# Altium schematic symbol library 6-Connectors 连接器.端子.SchLib: 402 symbols (part 4 of 5)
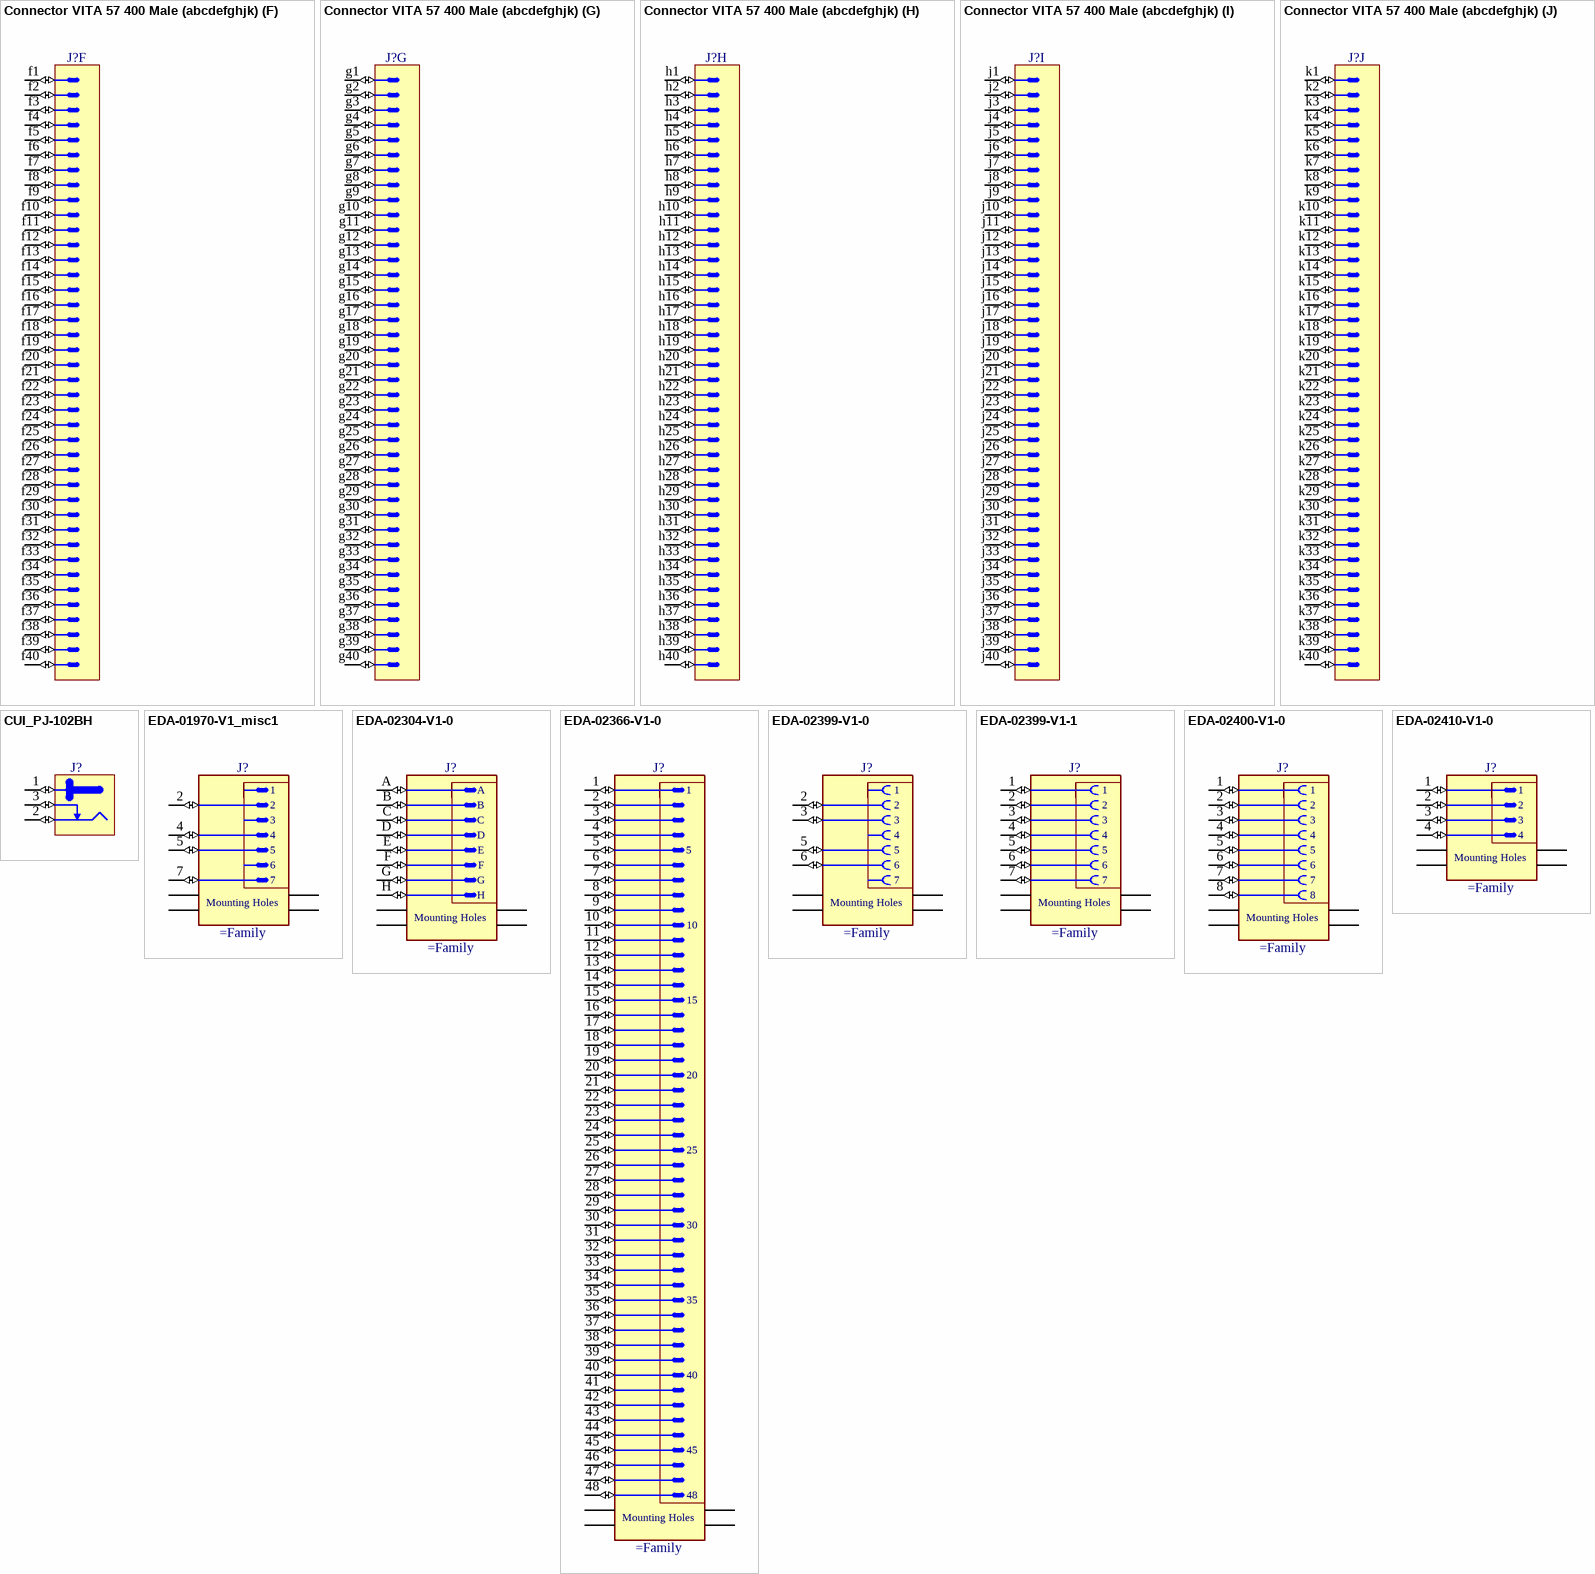
[diagram p52: symbols Connector VITA 57 400 Male (abcdefghjk) to EDA-02410-V1-0]

## EDA-02410-V1-0
designator J?
SOURIAU UTO0104P21T Adapter Kit For PCB Mount, 4 Poles, Shell Size 10, UT Bantam Circular Male Connector
pins: 1 (io), 2 (io), 3 (io), 4 (io), MECH1 (power), MECH2 (power), MECH3 (power), MECH4 (power)
text: Mounting; Holes

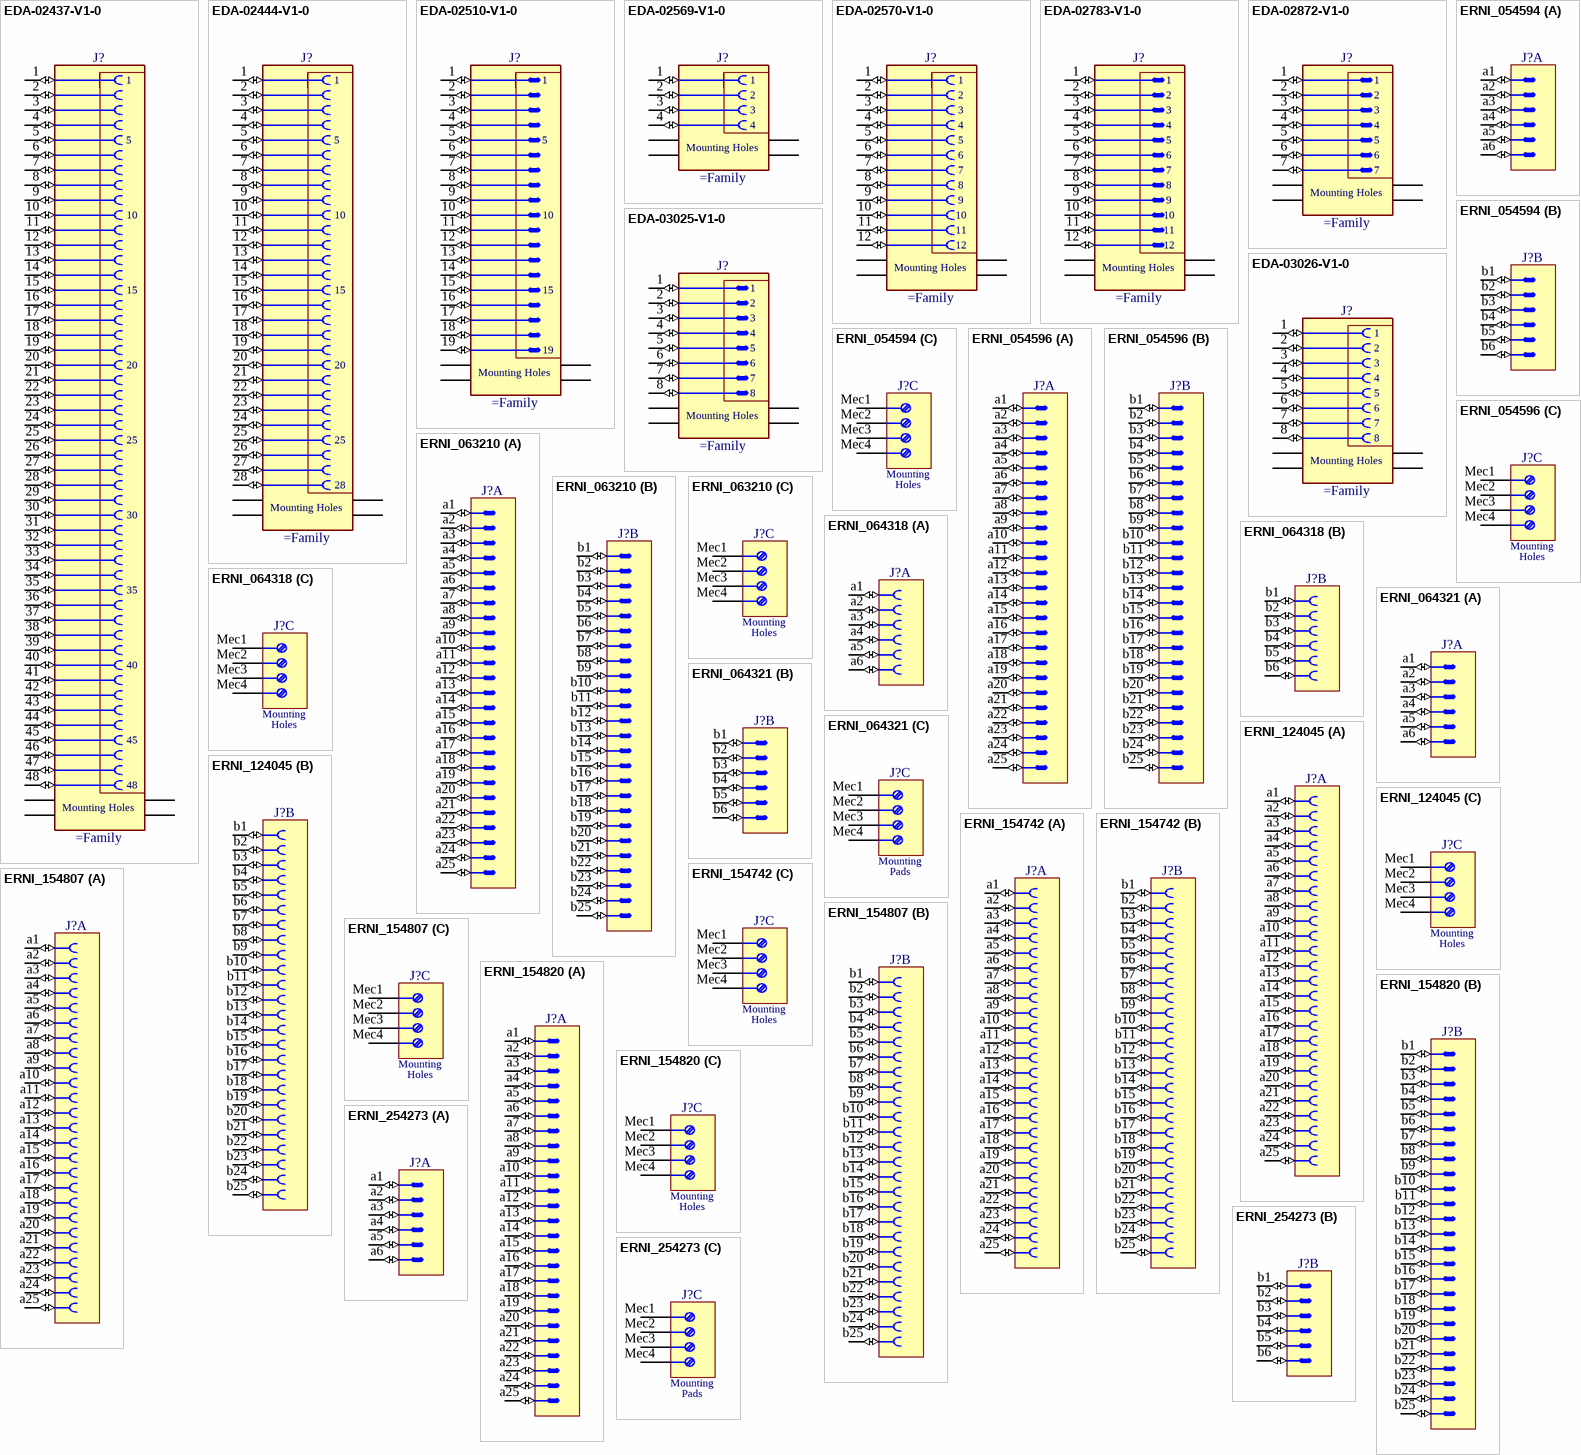
[diagram p35: symbols EDA-02437-V1-0 to ERNI_254273]

## EDA-02437-V1-0
designator J?
Adapter Kit For PCB Mount For SOURIAU UTO02448S21T, 48 Poles, Shell Size 24, UT Bantam Circular Female Connector. UTO Series
pins: 1 (io), 2 (io), 3 (io), 4 (io), 5 (io), 6 (io), 7 (io), 8 (io), 9 (io), 10 (io), 11 (io), 12 (io), 13 (io), 14 (io), 15 (io), 16 (io), 17 (io), 18 (io), 19 (io), 20 (io), 21 (io), 22 (io), 23 (io), 24 (io), 25 (io), 26 (io), 27 (io), 28 (io), 29 (io), 30 (io), 31 (io), 32 (io), 33 (io), 34 (io), 35 (io), 36 (io), 37 (io), 38 (io), 39 (io), 40 (io), 41 (io), 42 (io), 43 (io), 44 (io), 45 (io), 46 (io), 47 (io), 48 (io), MECH1 (power), MECH2 (power), MECH3 (power), MECH4 (power)
text: Mounting; Holes

## EDA-02444-V1-0
designator J?
Adapter Kit For PCB Mount For SOURIAU UTG02028S03, 28 Poles, Shell Size 20, Metalok Bantam Circular Female Connector. UTG Series
pins: 1 (io), 2 (io), 3 (io), 4 (io), 5 (io), 6 (io), 7 (io), 8 (io), 9 (io), 10 (io), 11 (io), 12 (io), 13 (io), 14 (io), 15 (io), 16 (io), 17 (io), 18 (io), 19 (io), 20 (io), 21 (io), 22 (io), 23 (io), 24 (io), 25 (io), 26 (io), 27 (io), 28 (io), MECH1 (power), MECH2 (power), MECH3 (power), MECH4 (power)
text: Mounting; Holes

## EDA-02510-V1-0
designator J?
SOURIAU UTO02448P21T Adapter Kit For PCB Mount, 19 Poles, Shell Size 16, UT Bantam Circular Male Connector
pins: 1 (io), 2 (io), 3 (io), 4 (io), 5 (io), 6 (io), 7 (io), 8 (io), 9 (io), 10 (io), 11 (io), 12 (io), 13 (io), 14 (io), 15 (io), 16 (io), 17 (io), 18 (io), 19 (io), MECH1 (power), MECH2 (power), MECH3 (power), MECH4 (power)
text: Mounting; Holes

## EDA-02569-V1-0
designator J?
SOURIAU UTO0104S21T Adapter Kit For PCB Mount, 4 Poles, Shell Size 10, UT Bantam Circular Female Connector
pins: 1 (io), 2 (io), 3 (io), 4 (io), MECH1 (power), MECH2 (power), MECH3 (power), MECH4 (power)
text: Mounting; Holes

## EDA-02570-V1-0
designator J?
SOURIAU UTO01412S21T Adapter Kit For PCB Mount, 12 Poles, Shell Size 14, UT Bantam Circular Female Connector
pins: 1 (io), 2 (io), 3 (io), 4 (io), 5 (io), 6 (io), 7 (io), 8 (io), 9 (io), 10 (io), 11 (io), 12 (io), MECH1 (power), MECH2 (power), MECH3 (power), MECH4 (power)
text: Mounting; Holes

## EDA-02783-V1-0
designator J?
SOURIAU UTO01412P21T Adapter Kit For PCB Mount, 12 Poles, Shell Size 14, UT Bantam Circular Male Connector
pins: 1 (io), 2 (io), 3 (io), 4 (io), 5 (io), 6 (io), 7 (io), 8 (io), 9 (io), 10 (io), 11 (io), 12 (io), MECH1 (power), MECH2 (power), MECH3 (power), MECH4 (power)
text: Mounting; Holes

## EDA-02872-V1-0
designator J?
SOURIAU UTG0187PVDEX Adapter Kit For PCB Mount, 7 Poles, VDE  Metalok Bantam Circular Male Connector
pins: 1 (io), 2 (io), 3 (io), 4 (io), 5 (io), 6 (io), 7 (io), MECH1 (power), MECH2 (power), MECH3 (power), MECH4 (power)
text: Mounting; Holes

## EDA-03025-V1-0
designator J?
SOURIAU UTO0128P21T Adapter Kit For PCB Mount, 8 Poles, Shell Size 12, UT Bantam Circular Male Connector
pins: 1 (io), 2 (io), 3 (io), 4 (io), 5 (io), 6 (io), 7 (io), 8 (io), MECH1 (power), MECH2 (power), MECH3 (power), MECH4 (power)
text: Mounting; Holes

## EDA-03026-V1-0
designator J?
SOURIAU UTO0128S21T Adapter Kit For PCB Mount, 8 Poles, Shell Size 12, UT Bantam Circular Female Connector
pins: 1 (io), 2 (io), 3 (io), 4 (io), 5 (io), 6 (io), 7 (io), 8 (io), MECH1 (power), MECH2 (power), MECH3 (power), MECH4 (power)
text: Mounting; Holes

## ERNI_054594
designator J?
12 Contacts Pitch 1.27 SMC Right Angle Male Connector Type B
part A pins: a1 1 (io), a2 2 (io), a3 3 (io), a4 4 (io), a5 5 (io), a6 6 (io)
part B pins: b1 1 (io), b2 2 (io), b3 3 (io), b4 4 (io), b5 5 (io), b6 6 (io)
part C pins: Mec1 "Mounting Fixture", Mec2 "Mounting Fixture", Mec3 "Mounting Fixture", Mec4 "Mounting Fixture"
part C text: Mounting; Holes

## ERNI_054596
designator J?
50 Contacts Pitch 1.27 SMC Right Angle Male Connector Type B
part A pins: a1 1 (io), a2 2 (io), a3 3 (io), a4 4 (io), a5 5 (io), a6 6 (io), a7 7 (io), a8 8 (io), a9 9 (io), a10 10 (io), a11 11 (io), a12 12 (io), a13 13 (io), a14 14 (io), a15 15 (io), a16 16 (io), a17 17 (io), a18 18 (io), a19 19 (io), a20 20 (io), a21 21 (io), a22 22 (io), a23 23 (io), a24 24 (io), a25 25 (io)
part B pins: b1 1 (io), b2 2 (io), b3 3 (io), b4 4 (io), b5 5 (io), b6 6 (io), b7 7 (io), b8 8 (io), b9 9 (io), b10 10 (io), b11 11 (io), b12 12 (io), b13 13 (io), b14 14 (io), b15 15 (io), b16 16 (io), b17 17 (io), b18 18 (io), b19 19 (io), b20 20 (io), b21 21 (io), b22 22 (io), b23 23 (io), b24 24 (io), b25 25 (io)
part C pins: Mec1 "Mounting Fixture", Mec2 "Mounting Fixture", Mec3 "Mounting Fixture", Mec4 "Mounting Fixture"
part C text: Mounting; Holes

## ERNI_063210
designator J?
50 Contacts Pitch 1.27 SMC Straight Male Connector Type Q
part A pins: a1 1 (io), a2 2 (io), a3 3 (io), a4 4 (io), a5 5 (io), a6 6 (io), a7 7 (io), a8 8 (io), a9 9 (io), a10 10 (io), a11 11 (io), a12 12 (io), a13 13 (io), a14 14 (io), a15 15 (io), a16 16 (io), a17 17 (io), a18 18 (io), a19 19 (io), a20 20 (io), a21 21 (io), a22 22 (io), a23 23 (io), a24 24 (io), a25 25 (io)
part B pins: b1 1 (io), b2 2 (io), b3 3 (io), b4 4 (io), b5 5 (io), b6 6 (io), b7 7 (io), b8 8 (io), b9 9 (io), b10 10 (io), b11 11 (io), b12 12 (io), b13 13 (io), b14 14 (io), b15 15 (io), b16 16 (io), b17 17 (io), b18 18 (io), b19 19 (io), b20 20 (io), b21 21 (io), b22 22 (io), b23 23 (io), b24 24 (io), b25 25 (io)
part C pins: Mec1 "Mounting Fixture", Mec2 "Mounting Fixture", Mec3 "Mounting Fixture", Mec4 "Mounting Fixture"
part C text: Mounting; Holes

## ERNI_064318
designator J?
12 Contacts Pitch 1.27 SMC Vertical Female Connector Type B
part A pins: a1 1 (io), a2 2 (io), a3 3 (io), a4 4 (io), a5 5 (io), a6 6 (io)
part B pins: b1 1 (io), b2 2 (io), b3 3 (io), b4 4 (io), b5 5 (io), b6 6 (io)
part C pins: Mec1 "Mounting Fixture", Mec2 "Mounting Fixture", Mec3 "Mounting Fixture", Mec4 "Mounting Fixture"
part C text: Mounting; Holes

## ERNI_064321
designator J?
12 Contacts Pitch 1.27 SMC Vertical Male Connector Type Q
part A pins: a1 1 (io), a2 2 (io), a3 3 (io), a4 4 (io), a5 5 (io), a6 6 (io)
part B pins: b1 1 (io), b2 2 (io), b3 3 (io), b4 4 (io), b5 5 (io), b6 6 (io)
part C pins: Mec1 "Mounting Fixture", Mec2 "Mounting Fixture", Mec3 "Mounting Fixture", Mec4 "Mounting Fixture"
part C text: Mounting; Pads

## ERNI_124045
designator J?
50 Contacts Pitch 1.27  SMC Straight  Female Connector Type B
part A pins: a1 1 (io), a2 2 (io), a3 3 (io), a4 4 (io), a5 5 (io), a6 6 (io), a7 7 (io), a8 8 (io), a9 9 (io), a10 10 (io), a11 11 (io), a12 12 (io), a13 13 (io), a14 14 (io), a15 15 (io), a16 16 (io), a17 17 (io), a18 18 (io), a19 19 (io), a20 20 (io), a21 21 (io), a22 22 (io), a23 23 (io), a24 24 (io), a25 25 (io)
part B pins: b1 1 (io), b2 2 (io), b3 3 (io), b4 4 (io), b5 5 (io), b6 6 (io), b7 7 (io), b8 8 (io), b9 9 (io), b10 10 (io), b11 11 (io), b12 12 (io), b13 13 (io), b14 14 (io), b15 15 (io), b16 16 (io), b17 17 (io), b18 18 (io), b19 19 (io), b20 20 (io), b21 21 (io), b22 22 (io), b23 23 (io), b24 24 (io), b25 25 (io)
part C pins: Mec1 "Mounting Fixture", Mec2 "Mounting Fixture", Mec3 "Mounting Fixture", Mec4 "Mounting Fixture"
part C text: Mounting; Holes

## ERNI_154742
designator J?
50 Contacts Pitch 1.27  SMC Right Angle Female Connector Type Q
part A pins: a1 1 (io), a2 2 (io), a3 3 (io), a4 4 (io), a5 5 (io), a6 6 (io), a7 7 (io), a8 8 (io), a9 9 (io), a10 10 (io), a11 11 (io), a12 12 (io), a13 13 (io), a14 14 (io), a15 15 (io), a16 16 (io), a17 17 (io), a18 18 (io), a19 19 (io), a20 20 (io), a21 21 (io), a22 22 (io), a23 23 (io), a24 24 (io), a25 25 (io)
part B pins: b1 1 (io), b2 2 (io), b3 3 (io), b4 4 (io), b5 5 (io), b6 6 (io), b7 7 (io), b8 8 (io), b9 9 (io), b10 10 (io), b11 11 (io), b12 12 (io), b13 13 (io), b14 14 (io), b15 15 (io), b16 16 (io), b17 17 (io), b18 18 (io), b19 19 (io), b20 20 (io), b21 21 (io), b22 22 (io), b23 23 (io), b24 24 (io), b25 25 (io)
part C pins: Mec1 "Mounting Fixture", Mec2 "Mounting Fixture", Mec3 "Mounting Fixture", Mec4 "Mounting Fixture"
part C text: Mounting; Holes

## ERNI_154807
designator J?
50 Contacts Pitch 1.27  SMC Straight  Female Connector Type B
part A pins: a1 1 (io), a2 2 (io), a3 3 (io), a4 4 (io), a5 5 (io), a6 6 (io), a7 7 (io), a8 8 (io), a9 9 (io), a10 10 (io), a11 11 (io), a12 12 (io), a13 13 (io), a14 14 (io), a15 15 (io), a16 16 (io), a17 17 (io), a18 18 (io), a19 19 (io), a20 20 (io), a21 21 (io), a22 22 (io), a23 23 (io), a24 24 (io), a25 25 (io)
part B pins: b1 1 (io), b2 2 (io), b3 3 (io), b4 4 (io), b5 5 (io), b6 6 (io), b7 7 (io), b8 8 (io), b9 9 (io), b10 10 (io), b11 11 (io), b12 12 (io), b13 13 (io), b14 14 (io), b15 15 (io), b16 16 (io), b17 17 (io), b18 18 (io), b19 19 (io), b20 20 (io), b21 21 (io), b22 22 (io), b23 23 (io), b24 24 (io), b25 25 (io)
part C pins: Mec1 "Mounting Fixture", Mec2 "Mounting Fixture", Mec3 "Mounting Fixture", Mec4 "Mounting Fixture"
part C text: Mounting; Holes

## ERNI_154820
designator J?
50 Contacts Pitch 1.27 SMC Straight Male Connector Type Q
part A pins: a1 1 (io), a2 2 (io), a3 3 (io), a4 4 (io), a5 5 (io), a6 6 (io), a7 7 (io), a8 8 (io), a9 9 (io), a10 10 (io), a11 11 (io), a12 12 (io), a13 13 (io), a14 14 (io), a15 15 (io), a16 16 (io), a17 17 (io), a18 18 (io), a19 19 (io), a20 20 (io), a21 21 (io), a22 22 (io), a23 23 (io), a24 24 (io), a25 25 (io)
part B pins: b1 1 (io), b2 2 (io), b3 3 (io), b4 4 (io), b5 5 (io), b6 6 (io), b7 7 (io), b8 8 (io), b9 9 (io), b10 10 (io), b11 11 (io), b12 12 (io), b13 13 (io), b14 14 (io), b15 15 (io), b16 16 (io), b17 17 (io), b18 18 (io), b19 19 (io), b20 20 (io), b21 21 (io), b22 22 (io), b23 23 (io), b24 24 (io), b25 25 (io)
part C pins: Mec1 "Mounting Fixture", Mec2 "Mounting Fixture", Mec3 "Mounting Fixture", Mec4 "Mounting Fixture"
part C text: Mounting; Holes

## ERNI_254273
designator J?
12 Contacts Pitch 1.27 SMC Right Angle Male Connector Type B
part A pins: a1 1 (io), a2 2 (io), a3 3 (io), a4 4 (io), a5 5 (io), a6 6 (io)
part B pins: b1 1 (io), b2 2 (io), b3 3 (io), b4 4 (io), b5 5 (io), b6 6 (io)
part C pins: Mec1 "Mounting Fixture", Mec2 "Mounting Fixture", Mec3 "Mounting Fixture", Mec4 "Mounting Fixture"
part C text: Mounting; Pads

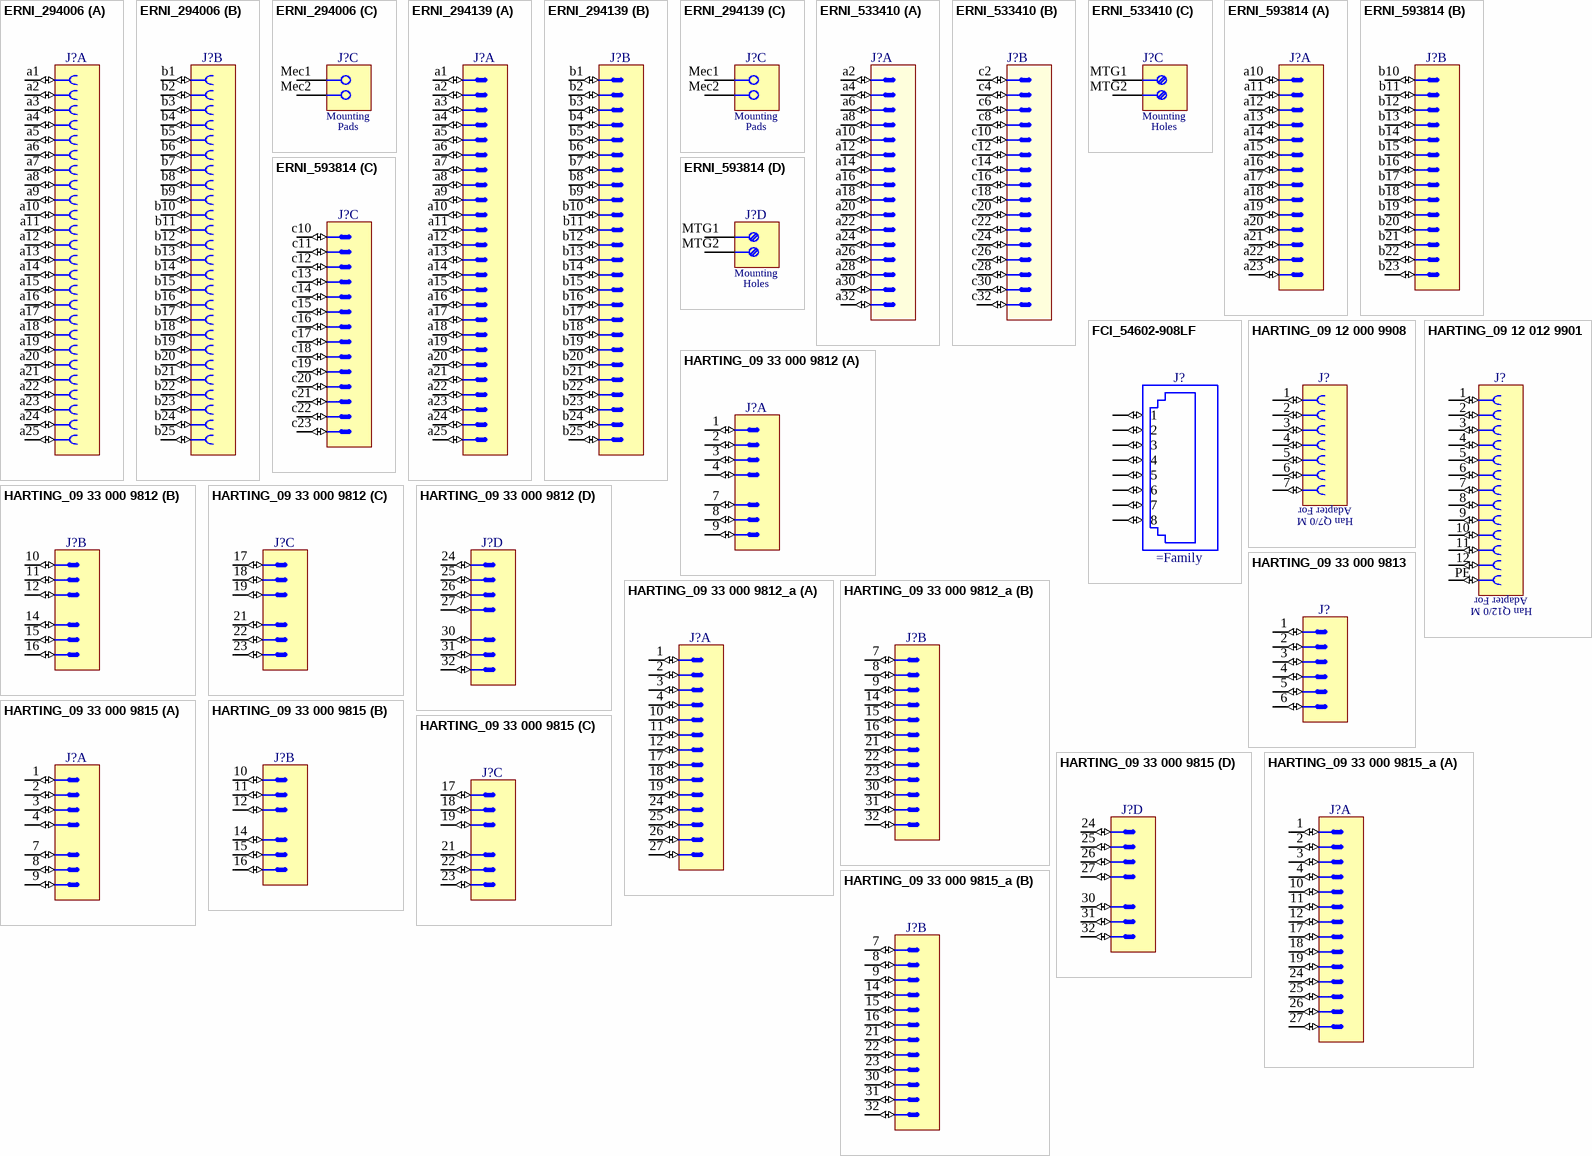
[diagram p36: symbols ERNI_294006 to HARTING_09 33 000 9815_a]

## ERNI_294006
designator J?
50 Contacts Pitch 0.8  SMT Vertical Female Connector Type MicroCon
part A pins: a1 1 (io), a2 2 (io), a3 3 (io), a4 4 (io), a5 5 (io), a6 6 (io), a7 7 (io), a8 8 (io), a9 9 (io), a10 10 (io), a11 11 (io), a12 12 (io), a13 13 (io), a14 14 (io), a15 15 (io), a16 16 (io), a17 17 (io), a18 18 (io), a19 19 (io), a20 20 (io), a21 21 (io), a22 22 (io), a23 23 (io), a24 24 (io), a25 25 (io)
part B pins: b1 1 (io), b2 2 (io), b3 3 (io), b4 4 (io), b5 5 (io), b6 6 (io), b7 7 (io), b8 8 (io), b9 9 (io), b10 10 (io), b11 11 (io), b12 12 (io), b13 13 (io), b14 14 (io), b15 15 (io), b16 16 (io), b17 17 (io), b18 18 (io), b19 19 (io), b20 20 (io), b21 21 (io), b22 22 (io), b23 23 (io), b24 24 (io), b25 25 (io)
part C pins: Mec1 "Mounting Fixture", Mec2 "Mounting Fixture"
part C text: Mounting; Pads

## ERNI_294139
designator J?
50 Contacts Pitch 0.8  SMT Vertical Male Connector Type MicroCon
part A pins: a1 1 (io), a2 2 (io), a3 3 (io), a4 4 (io), a5 5 (io), a6 6 (io), a7 7 (io), a8 8 (io), a9 9 (io), a10 10 (io), a11 11 (io), a12 12 (io), a13 13 (io), a14 14 (io), a15 15 (io), a16 16 (io), a17 17 (io), a18 18 (io), a19 19 (io), a20 20 (io), a21 21 (io), a22 22 (io), a23 23 (io), a24 24 (io), a25 25 (io)
part B pins: b1 1 (io), b2 2 (io), b3 3 (io), b4 4 (io), b5 5 (io), b6 6 (io), b7 7 (io), b8 8 (io), b9 9 (io), b10 10 (io), b11 11 (io), b12 12 (io), b13 13 (io), b14 14 (io), b15 15 (io), b16 16 (io), b17 17 (io), b18 18 (io), b19 19 (io), b20 20 (io), b21 21 (io), b22 22 (io), b23 23 (io), b24 24 (io), b25 25 (io)
part C pins: Mec1 "Mounting Fixture", Mec2 "Mounting Fixture"
part C text: Mounting; Pads

## ERNI_533410
designator J?
Eurocard DIN 41612, Type C, 32 Position, Rows a+c, Performance level 2, Male, Lead 3.0 mm, Pitch 2.54 mm
part A pins: a2 (io), a4 (io), a6 (io), a8 (io), a10 (io), a12 (io), a14 (io), a16 (io), a18 (io), a20 (io), a22 (io), a24 (io), a26 (io), a28 (io), a30 (io), a32 (io)
part B pins: c2 (io), c4 (io), c6 (io), c8 (io), c10 (io), c12 (io), c14 (io), c16 (io), c18 (io), c20 (io), c22 (io), c24 (io), c26 (io), c28 (io), c30 (io), c32 (io)
part C pins: MTG1 "Mounting Fixture", MTG2 "Mounting Fixture"
part C text: Mounting; Holes

## ERNI_593814
designator J?
DIN 41612, Type M, 42 + 6 Special Contacts, Male, Right Angle Connector
part A pins: a10 (io), a11 (io), a12 (io), a13 (io), a14 (io), a15 (io), a16 (io), a17 (io), a18 (io), a19 (io), a20 (io), a21 (io), a22 (io), a23 (io)
part B pins: b10 (io), b11 (io), b12 (io), b13 (io), b14 (io), b15 (io), b16 (io), b17 (io), b18 (io), b19 (io), b20 (io), b21 (io), b22 (io), b23 (io)
part C pins: c10 (io), c11 (io), c12 (io), c13 (io), c14 (io), c15 (io), c16 (io), c17 (io), c18 (io), c19 (io), c20 (io), c21 (io), c22 (io), c23 (io)
part D pins: MTG1 "Mounting Fixture", MTG2 "Mounting Fixture"
part D text: Mounting; Holes

## FCI_54602-908LF
designator J?
1 Port, 8 Positions, CAT3 RJ45 Horizontal Modular Jack
pins: 1 (io), 2 (io), 3 (io), 4 (io), 5 (io), 6 (io), 7 (io), 8 (io)

## HARTING_09 12 000 9908
designator J?
7 Positions, PC Board Adaptor For Han Q7/0® Module (PCB Thickness up to 2.4 mm)
pins: 1M7F 1 (io), 2M6F 2 (io), 3M5F 3 (io), 4M4F 4 (io), 5M3F 5 (io), 6M2F 6 (io), 7M1F 7 (io)
text: Adapter For; Han Q7/0 M

## HARTING_09 12 012 9901
designator J?
12 Positions + PE, PC Board Adaptor For Han Q12/0® Module (PCB Thickness up to 2.4 mm)
pins: 1M4F 1 (io), 2M3F 2 (io), 3M2F 3 (io), 4M1F 4 (io), 5M8F 5 (io), 6M7F 6 (io), 7M6F 7 (io), 8M5F 8 (io), 9M10F 9 (io), 10M9F 10 (io), 11M12F 11 (io), 12M11F 12 (io), PE 13 (io)
text: Adapter For; Han Q12/0 M

## HARTING_09 33 000 9812
designator J?
Han 32EE-f PCB Matrix With Contacts
part A pins: 1 (io), 2 (io), 3 (io), 4 (io), 7 (io), 8 (io), 9 (io)
part B pins: 10 (io), 11 (io), 12 (io), 14 (io), 15 (io), 16 (io)
part C pins: 17 (io), 18 (io), 19 (io), 21 (io), 22 (io), 23 (io)
part D pins: 24 (io), 25 (io), 26 (io), 27 (io), 30 (io), 31 (io), 32 (io)

## HARTING_09 33 000 9812_a
designator J?
Han 32EE-f PCB Matrix With Contacts
part A pins: 1 (io), 2 (io), 3 (io), 4 (io), 10 (io), 11 (io), 12 (io), 17 (io), 18 (io), 19 (io), 24 (io), 25 (io), 26 (io), 27 (io)
part B pins: 7 (io), 8 (io), 9 (io), 14 (io), 15 (io), 16 (io), 21 (io), 22 (io), 23 (io), 30 (io), 31 (io), 32 (io)

## HARTING_09 33 000 9813
designator J?
Han 6E-m PCB Matrix With Contacts
pins: 1 (io), 2 (io), 3 (io), 4 (io), 5 (io), 6 (io)

## HARTING_09 33 000 9815
designator J?
Han 32EE-m PCB Matrix With Contacts
part A pins: 1 (io), 2 (io), 3 (io), 4 (io), 7 (io), 8 (io), 9 (io)
part B pins: 10 (io), 11 (io), 12 (io), 14 (io), 15 (io), 16 (io)
part C pins: 17 (io), 18 (io), 19 (io), 21 (io), 22 (io), 23 (io)
part D pins: 24 (io), 25 (io), 26 (io), 27 (io), 30 (io), 31 (io), 32 (io)

## HARTING_09 33 000 9815_a
designator J?
Han 32EE-m PCB Matrix With Contacts
part A pins: 1 (io), 2 (io), 3 (io), 4 (io), 10 (io), 11 (io), 12 (io), 17 (io), 18 (io), 19 (io), 24 (io), 25 (io), 26 (io), 27 (io)
part B pins: 7 (io), 8 (io), 9 (io), 14 (io), 15 (io), 16 (io), 21 (io), 22 (io), 23 (io), 30 (io), 31 (io), 32 (io)

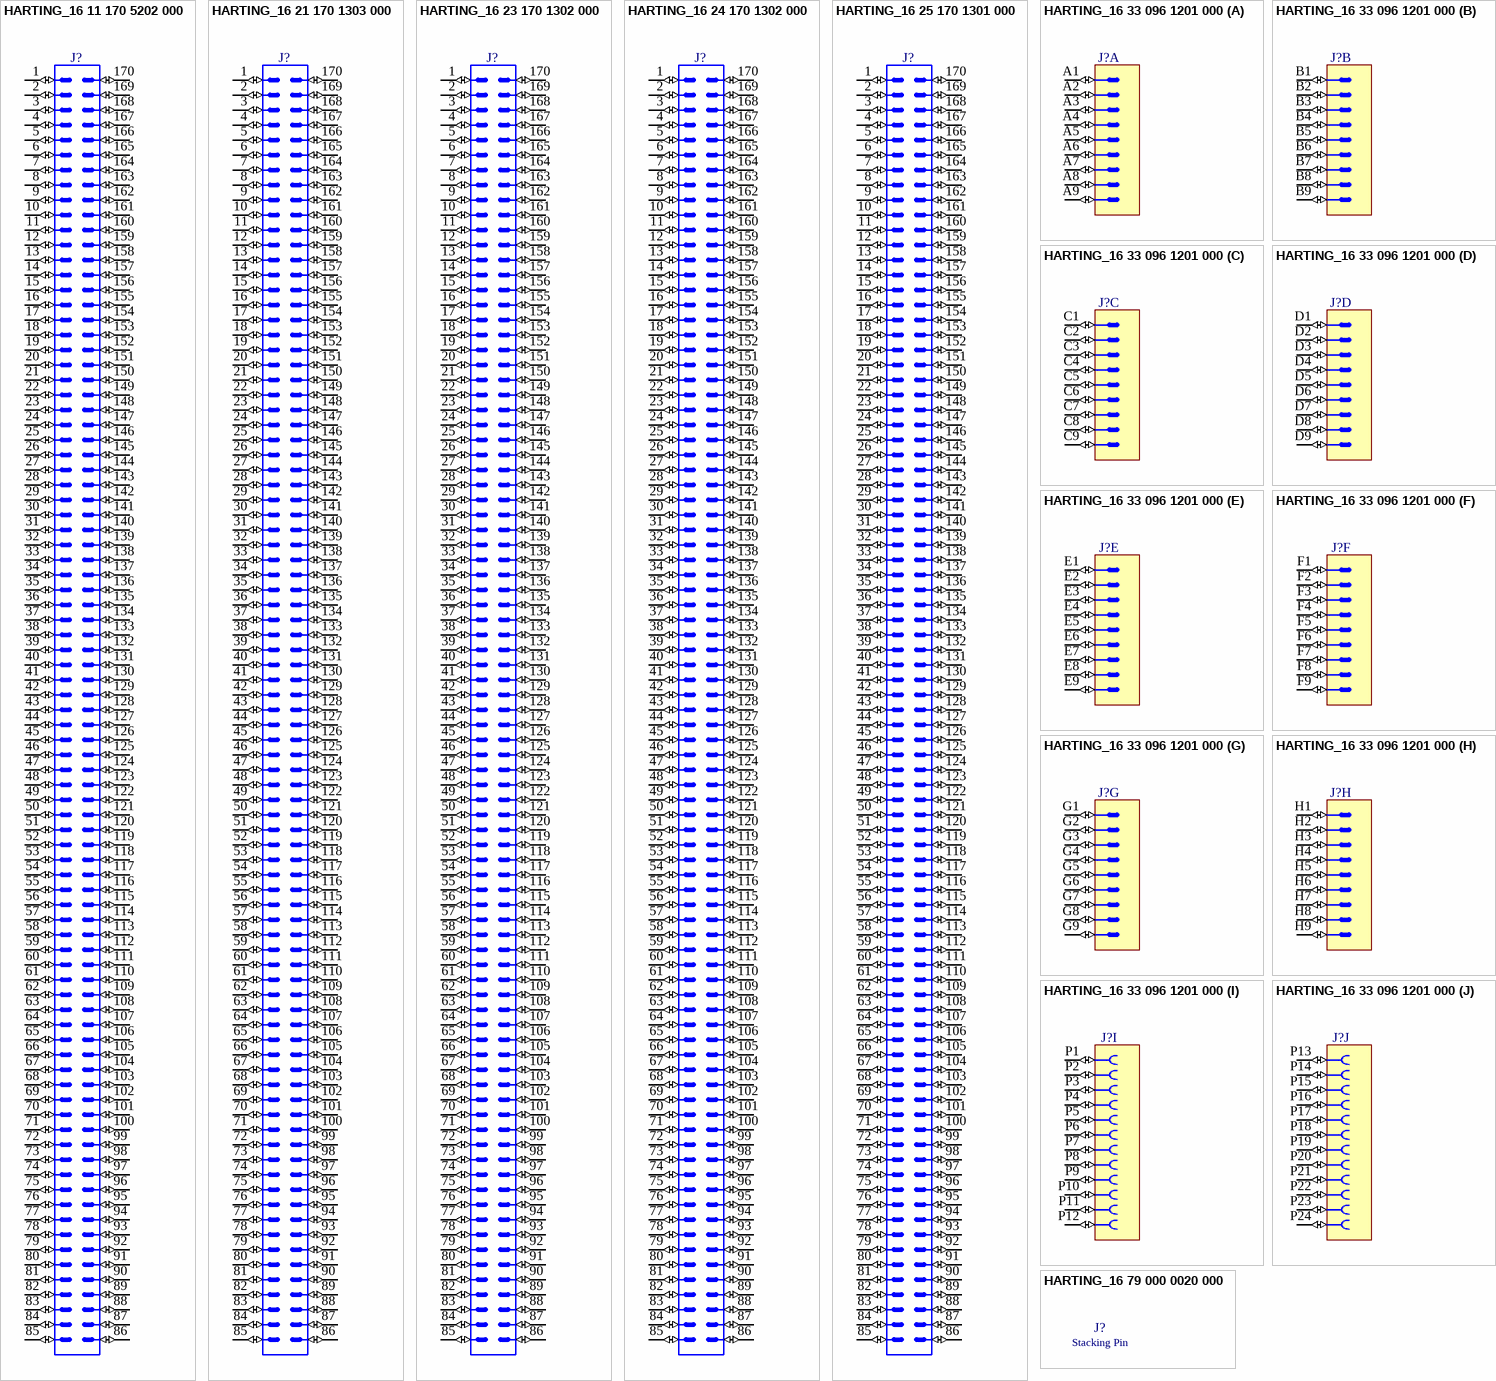
[diagram p37: symbols HARTING_16 11 170 5202 000 to HARTING_16 79 000 0020 000]

## HARTING_16 11 170 5202 000
designator J?
170 Poles, Press-Fit, AdvancedMC Connector for MicroTCA
pins: 1 (io), 2 (io), 3 (io), 4 (io), 5 (io), 6 (io), 7 (io), 8 (io), 9 (io), 10 (io), 11 (io), 12 (io), 13 (io), 14 (io), 15 (io), 16 (io), 17 (io), 18 (io), 19 (io), 20 (io), 21 (io), 22 (io), 23 (io), 24 (io), 25 (io), 26 (io), 27 (io), 28 (io), 29 (io), 30 (io), 31 (io), 32 (io), 33 (io), 34 (io), 35 (io), 36 (io), 37 (io), 38 (io), 39 (io), 40 (io), 41 (io), 42 (io), 43 (io), 44 (io), 45 (io), 46 (io), 47 (io), 48 (io), 49 (io), 50 (io), 51 (io), 52 (io), 53 (io), 54 (io), 55 (io), 56 (io), 57 (io), 58 (io), 59 (io), 60 (io), 61 (io), 62 (io), 63 (io), 64 (io), 65 (io), 66 (io), 67 (io), 68 (io), 69 (io), 70 (io), 71 (io), 72 (io), 73 (io), 74 (io), 75 (io), 76 (io), 77 (io), 78 (io), 79 (io), 80 (io), 81 (io), 82 (io), 83 (io), 84 (io), 85 (io), 86 (io), 87 (io), 88 (io), 89 (io), 90 (io), 91 (io), 92 (io), 93 (io), 94 (io), 95 (io), 96 (io), 97 (io), 98 (io), 99 (io), 100 (io), 101 (io), 102 (io), 103 (io), 104 (io), 105 (io), 106 (io), 107 (io), 108 (io), 109 (io), 110 (io), 111 (io), 112 (io), 113 (io), 114 (io), 115 (io), 116 (io), 117 (io), 118 (io), 119 (io), 120 (io), 121 (io), 122 (io), 123 (io), 124 (io), 125 (io), 126 (io), 127 (io), 128 (io), 129 (io), 130 (io), 131 (io), 132 (io), 133 (io), 134 (io), 135 (io), 136 (io), 137 (io), 138 (io), 139 (io), 140 (io), 141 (io), 142 (io), 143 (io), 144 (io), 145 (io), 146 (io), 147 (io), 148 (io), 149 (io), 150 (io), 151 (io), 152 (io), 153 (io), 154 (io), 155 (io), 156 (io), 157 (io), 158 (io), 159 (io), 160 (io), 161 (io), 162 (io), 163 (io), 164 (io), 165 (io), 166 (io), 167 (io), 168 (io), 169 (io), 170 (io)

## HARTING_16 21 170 1303 000
designator J?
170 Poles, Extended Side, Advanced Mezzanine Card Plug Connector, AMC
pins: 1 (io), 2 (io), 3 (io), 4 (io), 5 (io), 6 (io), 7 (io), 8 (io), 9 (io), 10 (io), 11 (io), 12 (io), 13 (io), 14 (io), 15 (io), 16 (io), 17 (io), 18 (io), 19 (io), 20 (io), 21 (io), 22 (io), 23 (io), 24 (io), 25 (io), 26 (io), 27 (io), 28 (io), 29 (io), 30 (io), 31 (io), 32 (io), 33 (io), 34 (io), 35 (io), 36 (io), 37 (io), 38 (io), 39 (io), 40 (io), 41 (io), 42 (io), 43 (io), 44 (io), 45 (io), 46 (io), 47 (io), 48 (io), 49 (io), 50 (io), 51 (io), 52 (io), 53 (io), 54 (io), 55 (io), 56 (io), 57 (io), 58 (io), 59 (io), 60 (io), 61 (io), 62 (io), 63 (io), 64 (io), 65 (io), 66 (io), 67 (io), 68 (io), 69 (io), 70 (io), 71 (io), 72 (io), 73 (io), 74 (io), 75 (io), 76 (io), 77 (io), 78 (io), 79 (io), 80 (io), 81 (io), 82 (io), 83 (io), 84 (io), 85 (io), 86 (io), 87 (io), 88 (io), 89 (io), 90 (io), 91 (io), 92 (io), 93 (io), 94 (io), 95 (io), 96 (io), 97 (io), 98 (io), 99 (io), 100 (io), 101 (io), 102 (io), 103 (io), 104 (io), 105 (io), 106 (io), 107 (io), 108 (io), 109 (io), 110 (io), 111 (io), 112 (io), 113 (io), 114 (io), 115 (io), 116 (io), 117 (io), 118 (io), 119 (io), 120 (io), 121 (io), 122 (io), 123 (io), 124 (io), 125 (io), 126 (io), 127 (io), 128 (io), 129 (io), 130 (io), 131 (io), 132 (io), 133 (io), 134 (io), 135 (io), 136 (io), 137 (io), 138 (io), 139 (io), 140 (io), 141 (io), 142 (io), 143 (io), 144 (io), 145 (io), 146 (io), 147 (io), 148 (io), 149 (io), 150 (io), 151 (io), 152 (io), 153 (io), 154 (io), 155 (io), 156 (io), 157 (io), 158 (io), 159 (io), 160 (io), 161 (io), 162 (io), 163 (io), 164 (io), 165 (io), 166 (io), 167 (io), 168 (io), 169 (io), 170 (io)

## HARTING_16 23 170 1302 000
designator J?
170 Poles, AdvancedMC-Plug Connector (Basic Side Mounting)
pins: 1 (io), 2 (io), 3 (io), 4 (io), 5 (io), 6 (io), 7 (io), 8 (io), 9 (io), 10 (io), 11 (io), 12 (io), 13 (io), 14 (io), 15 (io), 16 (io), 17 (io), 18 (io), 19 (io), 20 (io), 21 (io), 22 (io), 23 (io), 24 (io), 25 (io), 26 (io), 27 (io), 28 (io), 29 (io), 30 (io), 31 (io), 32 (io), 33 (io), 34 (io), 35 (io), 36 (io), 37 (io), 38 (io), 39 (io), 40 (io), 41 (io), 42 (io), 43 (io), 44 (io), 45 (io), 46 (io), 47 (io), 48 (io), 49 (io), 50 (io), 51 (io), 52 (io), 53 (io), 54 (io), 55 (io), 56 (io), 57 (io), 58 (io), 59 (io), 60 (io), 61 (io), 62 (io), 63 (io), 64 (io), 65 (io), 66 (io), 67 (io), 68 (io), 69 (io), 70 (io), 71 (io), 72 (io), 73 (io), 74 (io), 75 (io), 76 (io), 77 (io), 78 (io), 79 (io), 80 (io), 81 (io), 82 (io), 83 (io), 84 (io), 85 (io), 86 (io), 87 (io), 88 (io), 89 (io), 90 (io), 91 (io), 92 (io), 93 (io), 94 (io), 95 (io), 96 (io), 97 (io), 98 (io), 99 (io), 100 (io), 101 (io), 102 (io), 103 (io), 104 (io), 105 (io), 106 (io), 107 (io), 108 (io), 109 (io), 110 (io), 111 (io), 112 (io), 113 (io), 114 (io), 115 (io), 116 (io), 117 (io), 118 (io), 119 (io), 120 (io), 121 (io), 122 (io), 123 (io), 124 (io), 125 (io), 126 (io), 127 (io), 128 (io), 129 (io), 130 (io), 131 (io), 132 (io), 133 (io), 134 (io), 135 (io), 136 (io), 137 (io), 138 (io), 139 (io), 140 (io), 141 (io), 142 (io), 143 (io), 144 (io), 145 (io), 146 (io), 147 (io), 148 (io), 149 (io), 150 (io), 151 (io), 152 (io), 153 (io), 154 (io), 155 (io), 156 (io), 157 (io), 158 (io), 159 (io), 160 (io), 161 (io), 162 (io), 163 (io), 164 (io), 165 (io), 166 (io), 167 (io), 168 (io), 169 (io), 170 (io)

## HARTING_16 24 170 1302 000
designator J?
170 Poles, MCH-Plug Connector (Basic Side)
pins: 1 (io), 2 (io), 3 (io), 4 (io), 5 (io), 6 (io), 7 (io), 8 (io), 9 (io), 10 (io), 11 (io), 12 (io), 13 (io), 14 (io), 15 (io), 16 (io), 17 (io), 18 (io), 19 (io), 20 (io), 21 (io), 22 (io), 23 (io), 24 (io), 25 (io), 26 (io), 27 (io), 28 (io), 29 (io), 30 (io), 31 (io), 32 (io), 33 (io), 34 (io), 35 (io), 36 (io), 37 (io), 38 (io), 39 (io), 40 (io), 41 (io), 42 (io), 43 (io), 44 (io), 45 (io), 46 (io), 47 (io), 48 (io), 49 (io), 50 (io), 51 (io), 52 (io), 53 (io), 54 (io), 55 (io), 56 (io), 57 (io), 58 (io), 59 (io), 60 (io), 61 (io), 62 (io), 63 (io), 64 (io), 65 (io), 66 (io), 67 (io), 68 (io), 69 (io), 70 (io), 71 (io), 72 (io), 73 (io), 74 (io), 75 (io), 76 (io), 77 (io), 78 (io), 79 (io), 80 (io), 81 (io), 82 (io), 83 (io), 84 (io), 85 (io), 86 (io), 87 (io), 88 (io), 89 (io), 90 (io), 91 (io), 92 (io), 93 (io), 94 (io), 95 (io), 96 (io), 97 (io), 98 (io), 99 (io), 100 (io), 101 (io), 102 (io), 103 (io), 104 (io), 105 (io), 106 (io), 107 (io), 108 (io), 109 (io), 110 (io), 111 (io), 112 (io), 113 (io), 114 (io), 115 (io), 116 (io), 117 (io), 118 (io), 119 (io), 120 (io), 121 (io), 122 (io), 123 (io), 124 (io), 125 (io), 126 (io), 127 (io), 128 (io), 129 (io), 130 (io), 131 (io), 132 (io), 133 (io), 134 (io), 135 (io), 136 (io), 137 (io), 138 (io), 139 (io), 140 (io), 141 (io), 142 (io), 143 (io), 144 (io), 145 (io), 146 (io), 147 (io), 148 (io), 149 (io), 150 (io), 151 (io), 152 (io), 153 (io), 154 (io), 155 (io), 156 (io), 157 (io), 158 (io), 159 (io), 160 (io), 161 (io), 162 (io), 163 (io), 164 (io), 165 (io), 166 (io), 167 (io), 168 (io), 169 (io), 170 (io)

## HARTING_16 25 170 1301 000
designator J?
170 Poles, Piggyback Plug Connector (Basic Side)
pins: 1 (io), 2 (io), 3 (io), 4 (io), 5 (io), 6 (io), 7 (io), 8 (io), 9 (io), 10 (io), 11 (io), 12 (io), 13 (io), 14 (io), 15 (io), 16 (io), 17 (io), 18 (io), 19 (io), 20 (io), 21 (io), 22 (io), 23 (io), 24 (io), 25 (io), 26 (io), 27 (io), 28 (io), 29 (io), 30 (io), 31 (io), 32 (io), 33 (io), 34 (io), 35 (io), 36 (io), 37 (io), 38 (io), 39 (io), 40 (io), 41 (io), 42 (io), 43 (io), 44 (io), 45 (io), 46 (io), 47 (io), 48 (io), 49 (io), 50 (io), 51 (io), 52 (io), 53 (io), 54 (io), 55 (io), 56 (io), 57 (io), 58 (io), 59 (io), 60 (io), 61 (io), 62 (io), 63 (io), 64 (io), 65 (io), 66 (io), 67 (io), 68 (io), 69 (io), 70 (io), 71 (io), 72 (io), 73 (io), 74 (io), 75 (io), 76 (io), 77 (io), 78 (io), 79 (io), 80 (io), 81 (io), 82 (io), 83 (io), 84 (io), 85 (io), 86 (io), 87 (io), 88 (io), 89 (io), 90 (io), 91 (io), 92 (io), 93 (io), 94 (io), 95 (io), 96 (io), 97 (io), 98 (io), 99 (io), 100 (io), 101 (io), 102 (io), 103 (io), 104 (io), 105 (io), 106 (io), 107 (io), 108 (io), 109 (io), 110 (io), 111 (io), 112 (io), 113 (io), 114 (io), 115 (io), 116 (io), 117 (io), 118 (io), 119 (io), 120 (io), 121 (io), 122 (io), 123 (io), 124 (io), 125 (io), 126 (io), 127 (io), 128 (io), 129 (io), 130 (io), 131 (io), 132 (io), 133 (io), 134 (io), 135 (io), 136 (io), 137 (io), 138 (io), 139 (io), 140 (io), 141 (io), 142 (io), 143 (io), 144 (io), 145 (io), 146 (io), 147 (io), 148 (io), 149 (io), 150 (io), 151 (io), 152 (io), 153 (io), 154 (io), 155 (io), 156 (io), 157 (io), 158 (io), 159 (io), 160 (io), 161 (io), 162 (io), 163 (io), 164 (io), 165 (io), 166 (io), 167 (io), 168 (io), 169 (io), 170 (io)

## HARTING_16 33 096 1201 000
designator J?
Thru-Hole Press-in Terminations, Lead 3.7 mm, 96 Positions (72 Signal +24 Power), Straight Micro TCA Backplane Connector
part A pins: A1 (io), A2 (io), A3 (io), A4 (io), A5 (io), A6 (io), A7 (io), A8 (io), A9 (io)
part B pins: B1 (io), B2 (io), B3 (io), B4 (io), B5 (io), B6 (io), B7 (io), B8 (io), B9 (io)
part C pins: C1 (io), C2 (io), C3 (io), C4 (io), C5 (io), C6 (io), C7 (io), C8 (io), C9 (io)
part D pins: D1 (io), D2 (io), D3 (io), D4 (io), D5 (io), D6 (io), D7 (io), D8 (io), D9 (io)
part E pins: E1 (io), E2 (io), E3 (io), E4 (io), E5 (io), E6 (io), E7 (io), E8 (io), E9 (io)
part F pins: F1 (io), F2 (io), F3 (io), F4 (io), F5 (io), F6 (io), F7 (io), F8 (io), F9 (io)
part G pins: G1 (io), G2 (io), G3 (io), G4 (io), G5 (io), G6 (io), G7 (io), G8 (io), G9 (io)
part H pins: H1 (io), H2 (io), H3 (io), H4 (io), H5 (io), H6 (io), H7 (io), H8 (io), H9 (io)
part I pins: P1 (io), P2 (io), P3 (io), P4 (io), P5 (io), P6 (io), P7 (io), P8 (io), P9 (io), P10 (io), P11 (io), P12 (io)
part J pins: P13 (io), P14 (io), P15 (io), P16 (io), P17 (io), P18 (io), P19 (io), P20 (io), P21 (io), P22 (io), P23 (io), P24 (io)